# Altium footprint library GBA.PcbLib: 110 footprints (part 5 of 7)
Each footprint in its own frame and in the unit in brackets; x right, y up, seen from the top. Pads: shape width x height; smd on the part's side, far side on the other; paste and mask are expansions set on the pad; w line width, h text height; cw(c..) or ccw(c..) is an arc to the next point about the centre after c.
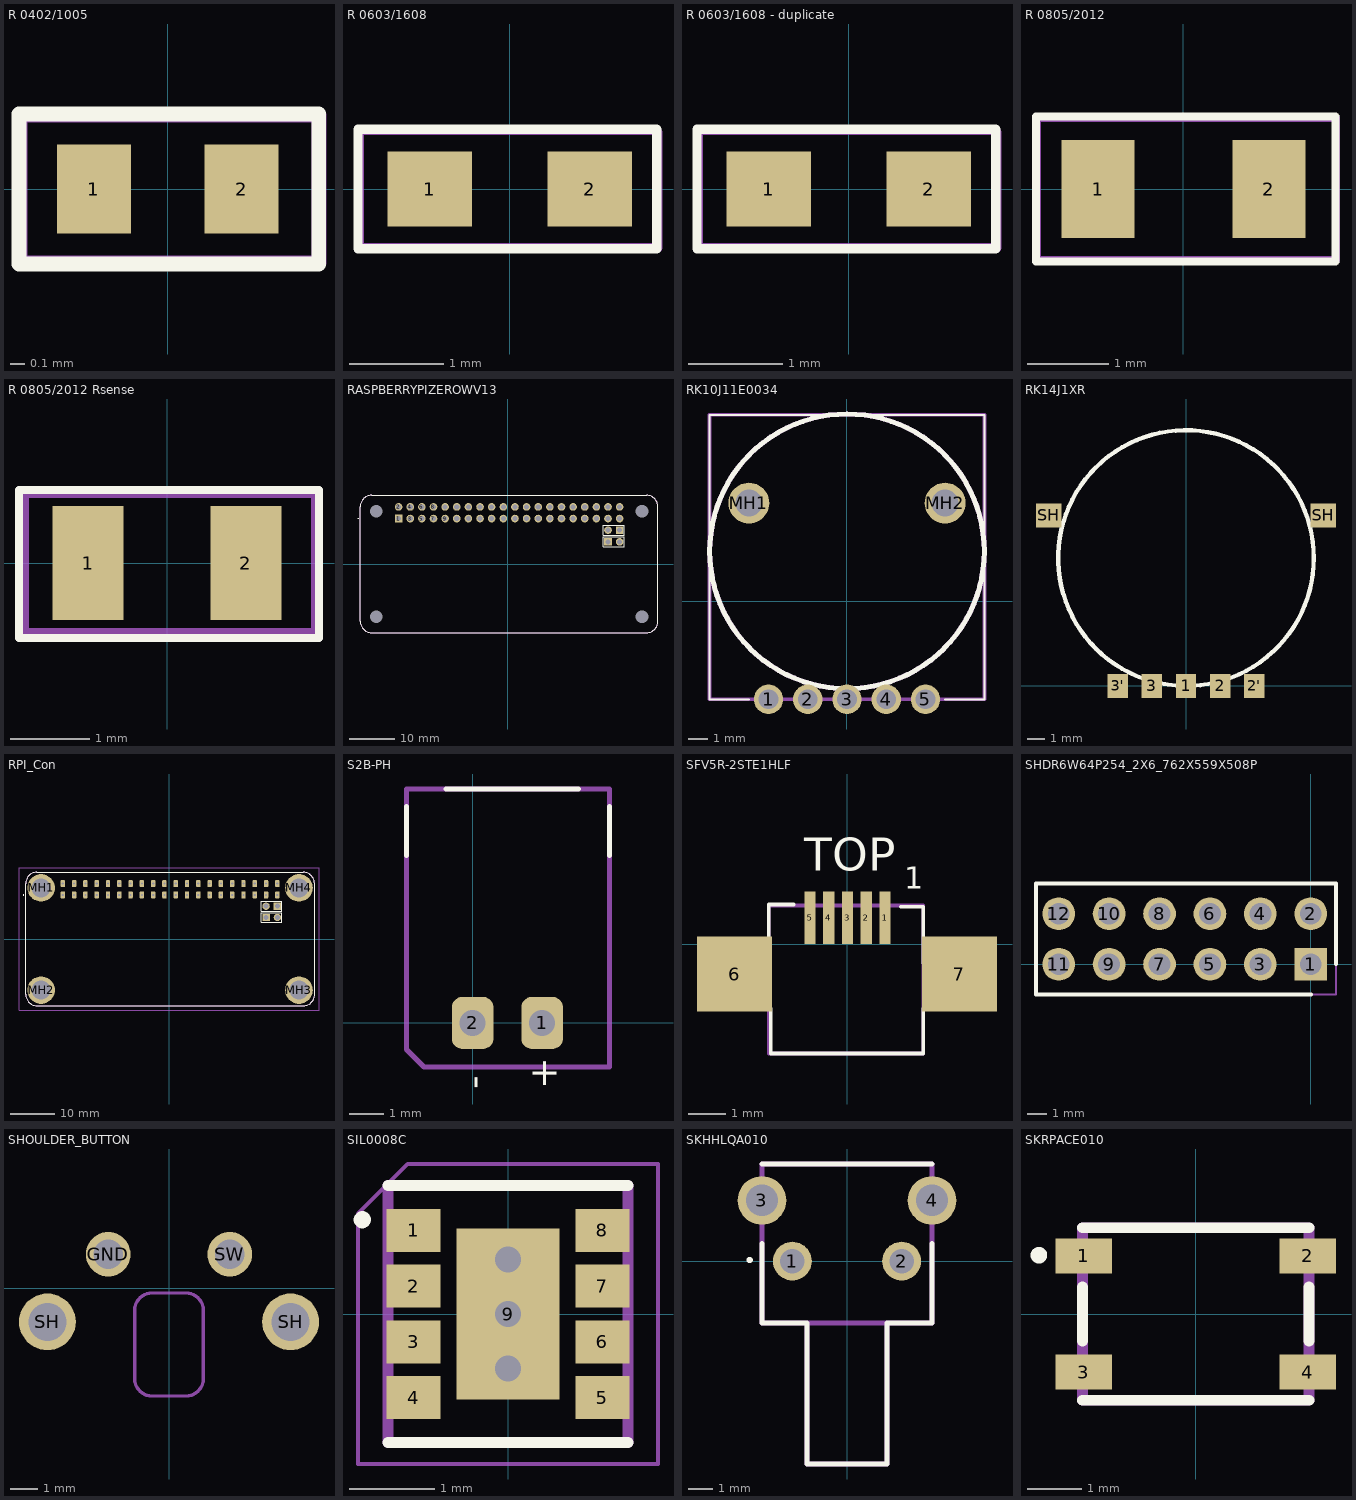
[diagram p4: the footprints below, top view; thin cyan lines are the x and y axes]

## R 0402/1005 [mm]
pads (2):
  rect 0.5x0.6 smd: 1(-0.5,0) 2(0.5,0)
Top Overlay:
  lines w0.1: -1.008,-0.508 -1.008,0.508 1.024,0.508 1.024,-0.508 -1.008,-0.508
Top Designator (Mech29):
  lines w0.1: -1,-0.5 1.025,-0.5 1.025,0.5 -1,0.5 -1,-0.5
  text ".Designator" at -0.85,-0.3 h0.6
3D body: height 0.64, standoff 0, extent 0.525,-0.3 0.75,0.3
3D body: height 0.64, standoff 0, extent -0.75,-0.3 -0.5,0.3
3D body: height 0.64, standoff 0, extent -0.5,-0.3 0.525,0.3

## R 0603/1608 [mm]
pads (2):
  rect 0.9x0.8 smd: 1(-0.85,0) 2(0.85,0)
Top Overlay:
  lines w0.1: -1.612,-0.635 1.563,-0.635 1.563,0.635 -1.612,0.635 -1.612,-0.635
Top Designator (Mech29):
  lines w0.1: -1.6,-0.625 1.575,-0.625 1.575,0.6 1.55,0.625 -1.6,0.625 -1.6,-0.625
  text ".Designator" at -1.425,-0.4 h0.8
3D body: height 0.64, standoff 0, extent 0.85,-0.4 1.3,0.4
3D body: height 0.64, standoff 0, extent -1.3,-0.4 -0.85,0.4
3D body: height 0.64, standoff 0, extent -0.85,-0.4 0.85,0.4

## R 0603/1608 - duplicate [mm]
pads (2):
  rect 0.9x0.8 smd: 1(-0.85,0) 2(0.85,0)
Top Overlay:
  lines w0.1: -1.612,-0.635 1.563,-0.635 1.563,0.635 -1.612,0.635 -1.612,-0.635
Top Designator (Mech29):
  lines w0.1: -1.6,-0.625 1.575,-0.625 1.575,0.6 1.55,0.625 -1.6,0.625 -1.6,-0.625
  text ".Designator" at -1.425,-0.4 h0.8
3D body: height 0.64, standoff 0, extent 0.85,-0.4 1.3,0.4
3D body: height 0.64, standoff 0, extent -1.3,-0.4 -0.85,0.4
3D body: height 0.64, standoff 0, extent -0.85,-0.4 0.85,0.4

## R 0805/2012 [mm]
pads (2):
  rect 0.9x1.2 smd: 1(-1.05,0) 2(1.05,0)
Top Overlay:
  lines w0.1: -1.812,-0.889 1.871,-0.889 1.871,0.889 -1.812,0.889 -1.812,-0.889
Top Designator (Mech29):
  lines w0.1: -1.8,-0.875 1.875,-0.875 1.875,0.875 -1.775,0.875 -1.8,0.85 -1.8,-0.875
  text ".Designator" at -1.65,-0.55 h1
3D body: height 0.64, standoff 0, extent -1.05,-0.6 1.1,0.6
3D body: height 0.64, standoff 0, extent -1.5,-0.6 -1.05,0.6
3D body: height 0.64, standoff 0, extent 1.1,-0.6 1.5,0.6

## R 0805/2012 Rsense [mm]
pads (2):
  rect 0.9x1.45 smd: 1(-1,0) 2(1,0)
Top Overlay:
  lines w0.1: -1.875,-0.95 -1.875,0.925 1.925,0.925 1.925,-0.95 -1.875,-0.95
Top Designator (Mech29):
  lines w0.1: -1.8,-0.875 -1.8,0.85 -1.775,0.875 1.875,0.875 1.875,-0.875 -1.8,-0.875
  text ".Designator" at -1.65,-0.55 h1
3D body: height 0.64, standoff 0, extent 0.943,-0.6 1.343,0.6
3D body: height 0.64, standoff 0, extent -1.368,-0.6 -0.918,0.6
3D body: height 0.64, standoff 0, extent -0.918,-0.6 0.943,0.6

## RASPBERRYPIZEROWV13 [mm]
pads (48):
  rect 1.665x1.665 hole 1.11: 1(-23.885,9.92) 41(24.375,7.38) 43(21.835,4.84)
  round 1.665 hole 1.11: 2(-23.885,12.46) 3(-21.345,9.92) 4(-21.345,12.46) 5(-18.805,9.92) 6(-18.805,12.46) 7(-16.265,9.92) 8(-16.265,12.46) 9(-13.725,9.92) 10(-13.725,12.46) 11(-11.185,9.92) 12(-11.185,12.46) 13(-8.645,9.92) 14(-8.645,12.46) 15(-6.105,9.92) 16(-6.105,12.46) 17(-3.565,9.92) 18(-3.565,12.46) 19(-1.025,9.92) 20(-1.025,12.46) 21(1.515,9.92) 22(1.515,12.46) 23(4.055,9.92) 24(4.055,12.46) 25(6.595,9.92) 26(6.595,12.46) 27(9.135,9.92) 28(9.135,12.46) 29(11.675,9.92) 30(11.675,12.46) 31(14.215,9.92) 32(14.215,12.46) 33(16.755,9.92) 34(16.755,12.46) 35(19.295,9.92) 36(19.295,12.46) 37(21.835,9.92) 38(21.835,12.46) 39(24.375,9.92) 40(24.375,12.46) 42(21.835,7.38) 44(24.375,4.84)
  round 1.4 hole 2.8 unplated: MH1(-28.755,11.5) MH2(-28.755,-11.5) MH3(29.245,-11.5) MH4(29.245,11.5)
Top Overlay:
  lines w0.1: -32.255,12.46 -32.255,-12.46 ccw(c-29.715,-12.46) -29.759,-15 ; -32.255,12.464 cw(c-29.755,12.499) -29.755,15 30.245,15 ; -29.755,-15 30.245,-15 ccw(c30.245,-12.499) 32.745,-12.464 ; 30.249,15 cw(c30.205,12.46) 32.745,12.46 32.745,-12.46 ; -32.695,9.84 cw(c-32.695,9.89) -32.695,9.94 cw(c-32.695,9.89) -32.695,9.84 ; 20.805,3.74 20.805,5.94 25.405,5.94 25.405,3.74 20.805,3.74 ; 20.805,6.28 20.805,8.48 25.405,8.48 25.405,6.28 20.805,6.28
Top Designator (Mech29):
  lines w0.2: -32.255,12.46 -32.255,-12.46 ccw(c-29.715,-12.46) -29.759,-15 ; -32.255,12.464 cw(c-29.755,12.499) -29.755,15 30.245,15 ; -29.755,-15 30.245,-15 ccw(c30.245,-12.499) 32.745,-12.464 ; 30.249,15 cw(c30.245,12.499) 32.745,12.46 32.745,-12.46
  text ".Designator" at -9.144,-3.429 h2
3D body "RapberryPiZero.STEP": height 4.55, standoff 0.1, extent -32.385,-16.498 32.615,14.732

## RK10J11E0034 [mm]
pads (7):
  round 1.5 hole 1: 1(-4,-5) 2(-2,-5) 3(0,-5) 4(2,-5) 5(4,-5)
  round 2.085 hole 1.39: MH1(-5,5) MH2(5,5)
Top Overlay:
  circle w0.254: c0,2.54 r7
  lines w0.1: -5,-5 -7,-5 -7,9.5 7,9.5 7,-5 5,-5
Top Designator:
  circle w0.254: c0,2.54 r7
  text ".Designator" at -1.333,0.588 h1
Mechanical 13:
  lines w0.2: -7,-5 7,-5 7,9.5 -7,9.5 -7,-5
3D body "RK10J1_E.STEP": height 1.8, standoff -2, extent -7,-5.11 7,9.54

## RK14J1XR [mm]
pads (7):
  rect 1.2x1.4 smd: 1(0,0) 2(2,0) 2'(4,0) 3(-2,0) 3'(-4,0)
  rect 1.5x1.4 smd: SH(-8.05,10) SH(8.05,10)
Top Overlay:
  circle w0.254: c0,7.5 r7.5
Top Designator (Mech29):
  text ".Designator" at -2.032,7.366 h1
3D body: height 1.27, standoff 0, extent -7.5,0 7.5,15

## RPI_Con [mm]
pads (48):
  rrect50% 1x1.6 hole 0.5: 1(-23.885,9.92) 2(-23.885,12.46) 3(-21.345,9.92) 4(-21.345,12.46) 5(-18.805,9.92) 6(-18.805,12.46) 7(-16.265,9.92) 8(-16.265,12.46) 9(-13.725,9.92) 10(-13.725,12.46) 11(-11.185,9.92) 12(-11.185,12.46) 13(-8.645,9.92) 14(-8.645,12.46) 15(-6.105,9.92) 16(-6.105,12.46) 17(-3.565,9.92) 18(-3.565,12.46) 19(-1.025,9.92) 20(-1.025,12.46) 21(1.515,9.92) 22(1.515,12.46) 23(4.055,9.92) 24(4.055,12.46) 25(6.595,9.92) 26(6.595,12.46) 27(9.135,9.92) 28(9.135,12.46) 29(11.675,9.92) 30(11.675,12.46) 31(14.215,9.92) 32(14.215,12.46) 33(16.755,9.92) 34(16.755,12.46) 35(19.295,9.92) 36(19.295,12.46) 37(21.835,9.92) 38(21.835,12.46) 39(24.375,9.92) 40(24.375,12.46)
  rect 1.665x1.665 hole 1.11: 41(24.375,7.38) 43(21.835,4.84)
  round 1.665 hole 1.11: 42(21.835,7.38) 44(24.375,4.84)
  round 6.2 hole 4.25 unplated: MH1(-28.755,11.5) MH2(-28.755,-11.5) MH3(29.245,-11.5) MH4(29.245,11.5)
Top Overlay:
  lines w0.1: -32.255,12.46 -32.255,-12.46 ccw(c-29.715,-12.46) -29.759,-15 ; -32.255,12.464 cw(c-29.755,12.499) -29.755,15 30.245,15 ; -29.755,-15 30.245,-15 ccw(c30.245,-12.499) 32.745,-12.464 ; 30.249,15 cw(c30.205,12.46) 32.745,12.46 32.745,-12.46 ; -32.695,9.84 ccw(c-32.695,9.89) -32.695,9.94 ccw(c-32.695,9.89) -32.695,9.84 ; 20.805,3.74 25.405,3.74 25.405,5.94 20.805,5.94 20.805,3.74 ; 20.805,6.28 25.405,6.28 25.405,8.48 20.805,8.48 20.805,6.28
Mechanical 13:
  lines w0.2: -32.255,12.46 -32.255,-12.46 ccw(c-29.715,-12.46) -29.759,-15 ; -32.255,12.464 cw(c-29.755,12.499) -29.755,15 30.245,15 ; -29.755,-15 30.245,-15 ccw(c30.245,-12.499) 32.745,-12.464 ; 30.249,15 cw(c30.245,12.499) 32.745,12.46 32.745,-12.46
Mechanical 15:
  lines w0.1: -33.745,-16 33.745,-16 33.745,16 -33.745,16 -33.745,-16
3D body "mill-max-0906-1-15-20-75-14-11-0.step": height 4.5, standoff -1.75, extent 3.141,11.546 4.969,13.374
3D body "RapberryPiZero.STEP": height 8.95, standoff 4.5, extent -32.119,-16.498 32.881,14.732
3D body "mill-max-0906-1-15-20-75-14-11-0.step": height 4.5, standoff -1.75, extent -24.799,9.006 -22.971,10.834
3D body "mill-max-0906-1-15-20-75-14-11-0.step": height 4.5, standoff -1.75, extent -22.259,9.006 -20.431,10.834
3D body "mill-max-0906-1-15-20-75-14-11-0.step": height 4.5, standoff -1.75, extent -17.179,9.006 -15.351,10.834
3D body "mill-max-0906-1-15-20-75-14-11-0.step": height 4.5, standoff -1.75, extent -19.719,9.006 -17.891,10.834
3D body "mill-max-0906-1-15-20-75-14-11-0.step": height 4.5, standoff -1.75, extent -12.099,9.006 -10.271,10.834
3D body "mill-max-0906-1-15-20-75-14-11-0.step": height 4.5, standoff -1.75, extent -9.559,9.006 -7.731,10.834
3D body "mill-max-0906-1-15-20-75-14-11-0.step": height 4.5, standoff -1.75, extent -14.639,9.006 -12.811,10.834
3D body "mill-max-0906-1-15-20-75-14-11-0.step": height 4.5, standoff -1.75, extent -17.179,9.006 -15.351,10.834
3D body "mill-max-0906-1-15-20-75-14-11-0.step": height 4.5, standoff -1.75, extent -1.939,9.006 -0.111,10.834
3D body "mill-max-0906-1-15-20-75-14-11-0.step": height 4.5, standoff -1.75, extent 0.601,9.006 2.429,10.834
3D body "mill-max-0906-1-15-20-75-14-11-0.step": height 4.5, standoff -1.75, extent -4.479,9.006 -2.651,10.834
3D body "mill-max-0906-1-15-20-75-14-11-0.step": height 4.5, standoff -1.75, extent -7.019,9.006 -5.191,10.834
3D body "mill-max-0906-1-15-20-75-14-11-0.step": height 4.5, standoff -1.75, extent 8.221,9.006 10.049,10.834
3D body "mill-max-0906-1-15-20-75-14-11-0.step": height 4.5, standoff -1.75, extent 10.761,9.006 12.589,10.834
3D body "mill-max-0906-1-15-20-75-14-11-0.step": height 4.5, standoff -1.75, extent 5.681,9.006 7.509,10.834
3D body "mill-max-0906-1-15-20-75-14-11-0.step": height 4.5, standoff -1.75, extent 3.141,9.006 4.969,10.834
3D body "mill-max-0906-1-15-20-75-14-11-0.step": height 4.5, standoff -1.75, extent 18.381,9.006 20.209,10.834
3D body "mill-max-0906-1-15-20-75-14-11-0.step": height 4.5, standoff -1.75, extent 20.921,9.006 22.749,10.834
3D body "mill-max-0906-1-15-20-75-14-11-0.step": height 4.5, standoff -1.75, extent 15.841,9.006 17.669,10.834
3D body "mill-max-0906-1-15-20-75-14-11-0.step": height 4.5, standoff -1.75, extent 13.301,9.006 15.129,10.834
3D body "mill-max-0906-1-15-20-75-14-11-0.step": height 4.5, standoff -1.75, extent 20.921,11.546 22.749,13.374
3D body "mill-max-0906-1-15-20-75-14-11-0.step": height 4.5, standoff -1.75, extent 23.461,11.546 25.289,13.374
3D body "mill-max-0906-1-15-20-75-14-11-0.step": height 4.5, standoff -1.75, extent 18.381,11.546 20.209,13.374
3D body "mill-max-0906-1-15-20-75-14-11-0.step": height 4.5, standoff -1.75, extent 15.841,11.546 17.669,13.374
3D body "mill-max-0906-1-15-20-75-14-11-0.step": height 4.5, standoff -1.75, extent 10.761,11.546 12.589,13.374
3D body "mill-max-0906-1-15-20-75-14-11-0.step": height 4.5, standoff -1.75, extent 13.301,11.546 15.129,13.374
3D body "mill-max-0906-1-15-20-75-14-11-0.step": height 4.5, standoff -1.75, extent 8.221,11.546 10.049,13.374
3D body "mill-max-0906-1-15-20-75-14-11-0.step": height 4.5, standoff -1.75, extent 5.681,11.546 7.509,13.374
3D body "mill-max-0906-1-15-20-75-14-11-0.step": height 4.5, standoff -1.75, extent 0.601,11.546 2.429,13.374
3D body "mill-max-0906-1-15-20-75-14-11-0.step": height 4.5, standoff -1.75, extent -1.939,11.546 -0.111,13.374
3D body "mill-max-0906-1-15-20-75-14-11-0.step": height 4.5, standoff -1.75, extent -4.479,11.546 -2.651,13.374
3D body "mill-max-0906-1-15-20-75-14-11-0.step": height 4.5, standoff -1.75, extent -9.559,11.546 -7.731,13.374
3D body "mill-max-0906-1-15-20-75-14-11-0.step": height 4.5, standoff -1.75, extent -7.019,11.546 -5.191,13.374
3D body "mill-max-0906-1-15-20-75-14-11-0.step": height 4.5, standoff -1.75, extent -12.099,11.546 -10.271,13.374
3D body "mill-max-0906-1-15-20-75-14-11-0.step": height 4.5, standoff -1.75, extent -14.639,11.546 -12.811,13.374
3D body "mill-max-0906-1-15-20-75-14-11-0.step": height 4.5, standoff -1.75, extent -19.719,11.546 -17.891,13.374
3D body "mill-max-0906-1-15-20-75-14-11-0.step": height 4.5, standoff -1.75, extent -17.179,11.546 -15.351,13.374
3D body "mill-max-0906-1-15-20-75-14-11-0.step": height 4.5, standoff -1.75, extent -22.259,11.546 -20.431,13.374
3D body "mill-max-0906-1-15-20-75-14-11-0.step": height 4.5, standoff -1.75, extent -24.799,11.546 -22.971,13.374
3D body "mill-max-0906-1-15-20-75-14-11-0.step": height 4.5, standoff -1.75, extent 23.461,9.006 25.289,10.834

## S2B-PH [mm]
pads (2):
  rrect50% 1.2x1.5 hole 0.75: 1(2,0) 2(0,0)
Top Overlay:
  lines w0.15: -1.905,4.826 -1.905,6.223 ; -0.762,6.731 3.048,6.731 ; 3.937,4.826 3.937,6.223
  text "+" at 2.425,-1.9 h0.8
  text "-" at 0.4,-1.9 h0.8
Top Designator (Mech29):
  lines w0.15: -1.905,-0.762 -1.397,-1.27 3.937,-1.27 3.937,-0.889 3.937,6.731 -1.905,6.731 -1.905,-0.762
3D body "HEADER (JST SxB-PH-K-S (RIGHT ANGLE)).step": height 4.9, standoff -1.9, extent -1.934,-0.838 3.966,6.762

## SFV5R-2STE1HLF [mm]
pads (7):
  rect 0.3x1.4 smd: 1(1.014,0.699) 2(0.514,0.699) 3(0.014,0.699) 4(-0.486,0.699) 5(-0.986,0.699)
  rect 2x2 smd: 6(-3,-0.8) 7(3,-0.8)
Top Overlay:
  lines w0.1: -2.084,-0.064 -2.084,1.058 -1.426,1.058 ; -2.032,-1.714 -2.032,-2.921 2.032,-2.921 2.032,-1.714 ; 1.434,0.998 2.032,0.998 2.032,0.57 2.032,-0.508
  text "1" at 1.524,1.27 h1
  text "TOP" at -1.143,1.668 h1.52
Top Designator (Mech29):
  lines w0.1: -2.084,-2.921 -2.084,1.028 2.032,1.028 2.032,-2.921 -2.084,-2.921
  text ".Designator" at -2.836,-3.231 h1.52
3D body "ssfv5r_2stlf.stp": height 1.87, standoff 0, extent -3.986,-4.202 4.014,0.698

## SHDR6W64P254_2X6_762X559X508P [mm]
pads (12):
  rect 1.65x1.65 hole 1.1: 1(0,0)
  round 1.65 hole 1.1: 2(0,2.54) 3(-2.54,0) 4(-2.54,2.54) 5(-5.08,0) 6(-5.08,2.54) 7(-7.62,0) 8(-7.62,2.54) 9(-10.16,0) 10(-10.16,2.54) 11(-12.7,0) 12(-12.7,2.54)
Top Overlay:
  lines w0.2: 0,-1.525 -13.843,-1.525 -13.843,4.065 1.27,4.065 1.27,0
Top Designator (Mech29):
  lines w0.1: -13.843,-1.525 -13.843,4.065 1.27,4.065 1.27,-1.525 -13.843,-1.525
  text ".Designator" at -4.572,0.889 h1
3D body "SLW-106-01-T-D.stp": height 4.57, standoff -2.92, extent -13.97,-1.206 1.27,3.747

## SHOULDER_BUTTON [mm]
pads (4):
  round 1.65 hole 1.1: GND(-2.25,1.25) SW(2.25,1.25)
  round 2.1 hole 1.4: SH(-4.5,-1.25) SH(4.5,-1.25)
Dimensions:
  lines w0.127: -1.27,-3.358 ccw(c-0.635,-3.358) -0.635,-3.993 0.635,-3.993 ccw(c0.635,-3.358) 1.27,-3.358 1.27,-0.818 ccw(c0.635,-0.818) 0.635,-0.183 -0.635,-0.183 ccw(c-0.635,-0.818) -1.27,-0.818 -1.27,-3.358

## SIL0008C [mm]
pads (9):
  rect 0.63x0.5 smd: 1(-1.1,0.975) 2(-1.1,0.325) 3(-1.1,-0.325) 4(-1.1,-0.975) 5(1.1,-0.975) 6(1.1,-0.325) 7(1.1,0.325) 8(1.1,0.975)
  rect 1.2x2 smd: 9(0,0)
via 0,0 diameter 0.55 hole 0.3
via 0,-0.635 diameter 0.55 hole 0.3
via 0,0.635 diameter 0.55 hole 0.3
Top Overlay:
  circle w0.1: c-1.7,1.1 r0.05
  lines w0.127: -1.4,-1.5 1.4,-1.5 ; -1.4,1.5 1.4,1.5
Top Paste:
  region: -0.521,-0.1 0.52,-0.1 0.52,-0.953 -0.521,-0.953
  region: -0.521,0.95 0.52,0.95 0.52,0.1 -0.521,0.1
  region: 0.852,-0.775 1.35,-0.775 1.35,-1.177 0.852,-1.177
  region: 0.852,1.175 1.35,1.175 1.35,0.777 0.852,0.777
  region: 0.852,-0.125 1.35,-0.125 1.35,-0.526 0.852,-0.526
  region: 0.852,0.525 1.35,0.525 1.35,0.125 0.852,0.125
  region: -1.353,-0.775 -0.85,-0.775 -0.85,-1.177 -1.353,-1.177
  region: -1.353,1.175 -0.85,1.175 -0.85,0.777 -1.353,0.777
  region: -1.353,-0.125 -0.85,-0.125 -0.85,-0.526 -1.353,-0.526
  region: -1.352,0.525 -0.85,0.525 -0.85,0.125 -1.352,0.125
Top Solder:
  region: -0.551,0.95 0.55,0.95 0.55,-0.952 -0.551,-0.952
  region: 0.852,-0.775 1.35,-0.775 1.35,-1.177 0.852,-1.177
  region: 0.853,1.175 1.35,1.175 1.35,0.778 0.853,0.778
  region: 0.853,-0.125 1.35,-0.125 1.35,-0.527 0.853,-0.527
  region: 0.852,0.525 1.35,0.525 1.35,0.125 0.852,0.125
  region: -1.353,-0.775 -0.85,-0.775 -0.85,-1.178 -1.353,-1.178
  region: -1.352,1.175 -0.85,1.175 -0.85,0.776 -1.352,0.776
  region: -1.351,-0.125 -0.85,-0.125 -0.85,-0.525 -1.351,-0.525
  region: -1.353,0.525 -0.85,0.525 -0.85,0.125 -1.353,0.125
Bottom 3D Body (Mech4):
  lines w0.127: -1.4,-1.5 -1.4,1.5 1.4,1.5 1.4,-1.5 -1.4,-1.5
Top Designator (Mech29):
  lines w0.05: -1.75,-1.75 -1.75,1.171 -1.171,1.75 1.75,1.75 1.75,-1.75 -1.75,-1.75
  text ".Designator" at -1.143,-0.381 h0.8
3D body "TPS82084SILT.step": height 1.33, standoff 0, extent -1.4,-1.476 1.4,1.524

## SKHHLQA010 [mm]
pads (4):
  round 1.6 hole 1: 1(-2.25,0) 2(2.25,0)
  round 2 hole 1.3: 3(-3.5,2.5) 4(3.5,2.5)
Top Overlay:
  circle w0.2: c-4.01,0.048 r0.031
  lines w0.2: -3.5,0.725 -3.5,-2.55 -1.65,-2.55 -1.65,-8.35 1.65,-8.35 1.65,-2.55 3.5,-2.55 3.5,0.725 ; -3.5,4 3.5,4
Mechanical 13:
  lines w0.2: -1.65,-2.55 -1.65,-8.35 1.65,-8.35 1.65,-2.55 ; -3.5,-2.55 3.5,-2.55 3.5,4 -3.5,4 -3.5,-2.55
Top Designator (Mech29):
  text ".Designator" at -1.905,0 h1
3D body "SKHHLQA010.stp": height 7.5, standoff -3.4, extent -4.25,-8.387 4.25,4.013

## SKRPACE010 [mm]
pads (4):
  rect 1.05x0.65 smd: 1(-2.075,1.075) 2(2.075,1.075) 3(-2.075,-1.075) 4(2.075,-1.075)
Top Overlay:
  circle w0.2: c-2.906,1.089 r0.053
  lines w0.2: -2.1,-1.6 2.1,-1.6 ; -2.1,-0.5 -2.1,0.5 ; -2.1,1.6 2.1,1.6 ; 2.1,-0.5 2.1,0.5
Mechanical 13:
  lines w0.2: -2.1,-1.6 -2.1,1.6 2.1,1.6 2.1,-1.6 -2.1,-1.6
Top Designator (Mech29):
  text ".Designator" at -1.651,-0.192 h1
3D body "SKRPACE010.stp": height 2.5, standoff 0, extent -2.3,-1.6 2.3,1.6